# Altium integrated library Lattice CPLD ispLSI.IntLib: 471 symbols (part 4 of 26)
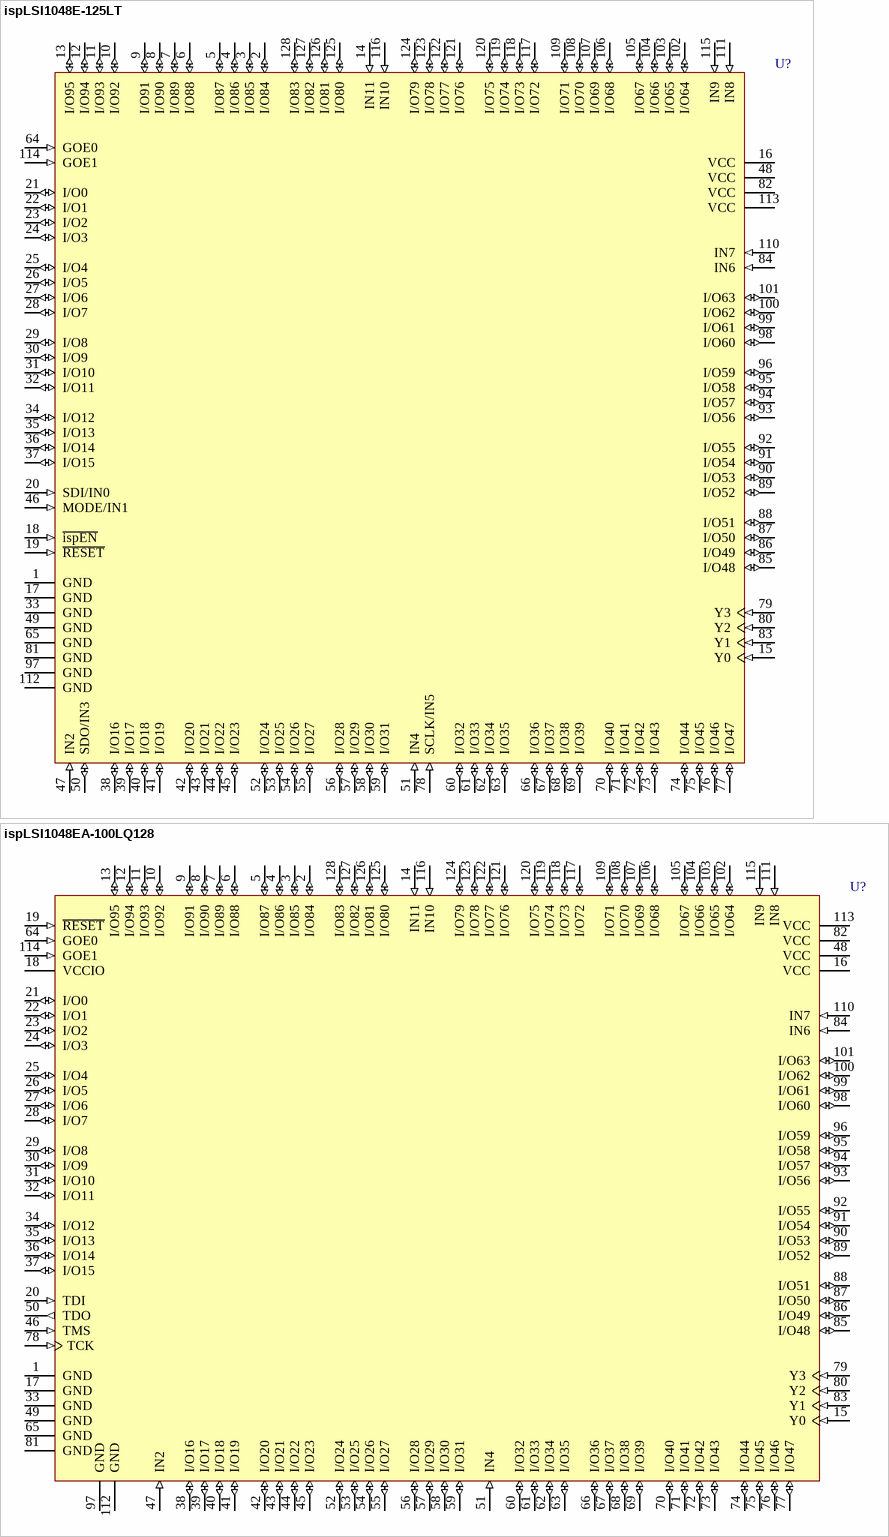
[diagram p234: symbols ispLSI1048E-125LT to ispLSI1048EA-100LQ128]

## ispLSI1048EA-100LQ128
designator U?
In-System Programmable High-Density PLD; Published: 23-Sep-2002; LatestRevisionDate: 13-Apr-2006; LatestRevisionNote: IPC-7351 Footprint Added.; DatasheetVersion: Jun-2000; PackageVersion: pkg_32, Aug-2005; PackageReference: PQFP128; Publisher: Altium Limited; PackageDescription: 128-Pin Quad Flat Pack 0.8 mm Pitch; Code_IPC: QFP80P3120X3120-128; ComponentLink1Description: Manufacturer Link; ComponentLink1URL: http://www.latticesemi.com/products/mature/index.cfm; ComponentLink2Description: Datasheet; ComponentLink2URL: http://www.latticesemi.com/lit/docs/datasheets/cpld/1048ea.pdf
footprint PQFP128_N (QFP, 128-Leads, Body 28x28mm, Pitch 0.8mm, IPC Medium Density)
footprint PQFP128_L (QFP, 128-Leads, Body 28x28mm, Pitch 0.8mm, IPC High Density)
footprint PQFP128_M (QFP, 128-Leads, Body 28x28mm, Pitch 0.8mm, IPC Low Density)
3D model 1048EA-PQFP128 (128-Pin Quad Flat Pack 0.8 mm Pitch)
pins: 1 GND (power), 2 I/O84 (io), 3 I/O85 (io), 4 I/O86 (io), 5 I/O87 (io), 6 I/O88 (io), 7 I/O89 (io), 8 I/O90 (io), 9 I/O91 (io), 10 I/O92 (io), 11 I/O93 (io), 12 I/O94 (io), 13 I/O95 (io), 14 IN11 (in), 15 Y0 (in), 16 VCC (power), 17 GND (power), 18 VCCIO (power), 19 ~{RESET} (in), 20 TDI (in), 21 I/O0 (io), 22 I/O1 (io), 23 I/O2 (io), 24 I/O3 (io), 25 I/O4 (io), 26 I/O5 (io), 27 I/O6 (io), 28 I/O7 (io), 29 I/O8 (io), 30 I/O9 (io), 31 I/O10 (io), 32 I/O11 (io), 33 GND (power), 34 I/O12 (io), 35 I/O13 (io), 36 I/O14 (io), 37 I/O15 (io), 38 I/O16 (io), 39 I/O17 (io), 40 I/O18 (io), 41 I/O19 (io), 42 I/O20 (io), 43 I/O21 (io), 44 I/O22 (io), 45 I/O23 (io), 46 TMS (in), 47 IN2 (in), 48 VCC (power), 49 GND (power), 50 TDO (out), 51 IN4 (in), 52 I/O24 (io), 53 I/O25 (io), 54 I/O26 (io), 55 I/O27 (io), 56 I/O28 (io), 57 I/O29 (io), 58 I/O30 (io), 59 I/O31 (io), 60 I/O32 (io), 61 I/O33 (io), 62 I/O34 (io), 63 I/O35 (io), 64 GOE0 (in), 65 GND (power), 66 I/O36 (io), 67 I/O37 (io), 68 I/O38 (io), 69 I/O39 (io), 70 I/O40 (io), 71 I/O41 (io), 72 I/O42 (io), 73 I/O43 (io), 74 I/O44 (io), 75 I/O45 (io), 76 I/O46 (io), 77 I/O47 (io), 78 TCK (in), 79 Y3 (in), 80 Y2 (in), 81 GND (power), 82 VCC (power), 83 Y1 (in), 84 IN6 (in), 85 I/O48 (io), 86 I/O49 (io), 87 I/O50 (io), 88 I/O51 (io), 89 I/O52 (io), 90 I/O53 (io), 91 I/O54 (io), 92 I/O55 (io), 93 I/O56 (io), 94 I/O57 (io), 95 I/O58 (io), 96 I/O59 (io), 97 GND (power), 98 I/O60 (io), 99 I/O61 (io), 100 I/O62 (io), 101 I/O63 (io), 102 I/O64 (io), 103 I/O65 (io), 104 I/O66 (io), 105 I/O67 (io), 106 I/O68 (io), 107 I/O69 (io), 108 I/O70 (io), 109 I/O71 (io), 110 IN7 (in), 111 IN8 (in), 112 GND (power), 113 VCC (power), 114 GOE1 (in), 115 IN9 (in), 116 IN10 (in), 117 I/O72 (io), 118 I/O73 (io), 119 I/O74 (io), 120 I/O75 (io), 121 I/O76 (io), 122 I/O77 (io), 123 I/O78 (io), 124 I/O79 (io), 125 I/O80 (io), 126 I/O81 (io), 127 I/O82 (io), 128 I/O83 (io)

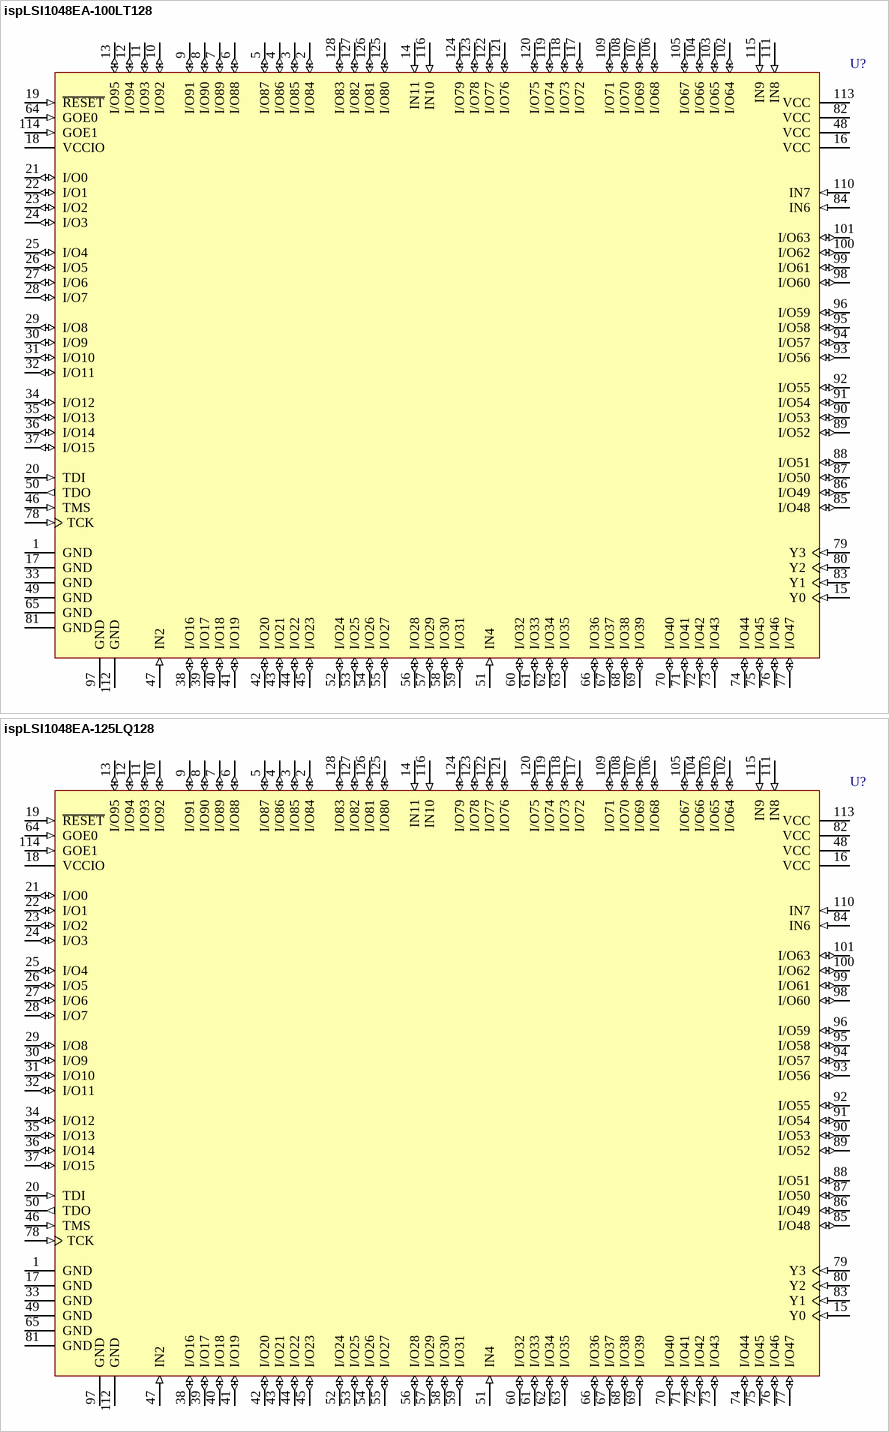
[diagram p29: symbols ispLSI1048EA-100LT128 to ispLSI1048EA-125LQ128]

## ispLSI1048EA-100LT128
designator U?
In-System Programmable High-Density PLD; Published: 23-Sep-2002; LatestRevisionDate: 13-Apr-2006; LatestRevisionNote: IPC-7351 Footprint Added.; DatasheetVersion: Jun-2000; PackageVersion: Aug-2005; PackageReference: TQFP128; Publisher: Altium Limited; PackageDescription: 128-Pin Thin Quad Flat Pack 0.4 mm Pitch; ComponentLink1Description: Manufacturer Link; ComponentLink1URL: http://www.latticesemi.com/products/mature/index.cfm; ComponentLink2Description: Datasheet; ComponentLink2URL: http://www.latticesemi.com/lit/docs/datasheets/cpld/1048ea.pdf
footprint TQFP128_N (Thin QFP, 128-Leads, Body 14x14mm, Pitch 0.4mm, IPC Medium Density)
footprint TQFP128_L (Thin QFP, 128-Leads, Body 14x14mm, Pitch 0.4mm, IPC High Density)
footprint TQFP128_M (Thin QFP, 128-Leads, Body 14x14mm, Pitch 0.4mm, IPC Low Density)
3D model 1048EA-TQFP128 (128-Pin Thin Quad Flat Pack 0.4 mm Pitch)
pins: 1 GND (power), 2 I/O84 (io), 3 I/O85 (io), 4 I/O86 (io), 5 I/O87 (io), 6 I/O88 (io), 7 I/O89 (io), 8 I/O90 (io), 9 I/O91 (io), 10 I/O92 (io), 11 I/O93 (io), 12 I/O94 (io), 13 I/O95 (io), 14 IN11 (in), 15 Y0 (in), 16 VCC (power), 17 GND (power), 18 VCCIO (power), 19 ~{RESET} (in), 20 TDI (in), 21 I/O0 (io), 22 I/O1 (io), 23 I/O2 (io), 24 I/O3 (io), 25 I/O4 (io), 26 I/O5 (io), 27 I/O6 (io), 28 I/O7 (io), 29 I/O8 (io), 30 I/O9 (io), 31 I/O10 (io), 32 I/O11 (io), 33 GND (power), 34 I/O12 (io), 35 I/O13 (io), 36 I/O14 (io), 37 I/O15 (io), 38 I/O16 (io), 39 I/O17 (io), 40 I/O18 (io), 41 I/O19 (io), 42 I/O20 (io), 43 I/O21 (io), 44 I/O22 (io), 45 I/O23 (io), 46 TMS (in), 47 IN2 (in), 48 VCC (power), 49 GND (power), 50 TDO (out), 51 IN4 (in), 52 I/O24 (io), 53 I/O25 (io), 54 I/O26 (io), 55 I/O27 (io), 56 I/O28 (io), 57 I/O29 (io), 58 I/O30 (io), 59 I/O31 (io), 60 I/O32 (io), 61 I/O33 (io), 62 I/O34 (io), 63 I/O35 (io), 64 GOE0 (in), 65 GND (power), 66 I/O36 (io), 67 I/O37 (io), 68 I/O38 (io), 69 I/O39 (io), 70 I/O40 (io), 71 I/O41 (io), 72 I/O42 (io), 73 I/O43 (io), 74 I/O44 (io), 75 I/O45 (io), 76 I/O46 (io), 77 I/O47 (io), 78 TCK (in), 79 Y3 (in), 80 Y2 (in), 81 GND (power), 82 VCC (power), 83 Y1 (in), 84 IN6 (in), 85 I/O48 (io), 86 I/O49 (io), 87 I/O50 (io), 88 I/O51 (io), 89 I/O52 (io), 90 I/O53 (io), 91 I/O54 (io), 92 I/O55 (io), 93 I/O56 (io), 94 I/O57 (io), 95 I/O58 (io), 96 I/O59 (io), 97 GND (power), 98 I/O60 (io), 99 I/O61 (io), 100 I/O62 (io), 101 I/O63 (io), 102 I/O64 (io), 103 I/O65 (io), 104 I/O66 (io), 105 I/O67 (io), 106 I/O68 (io), 107 I/O69 (io), 108 I/O70 (io), 109 I/O71 (io), 110 IN7 (in), 111 IN8 (in), 112 GND (power), 113 VCC (power), 114 GOE1 (in), 115 IN9 (in), 116 IN10 (in), 117 I/O72 (io), 118 I/O73 (io), 119 I/O74 (io), 120 I/O75 (io), 121 I/O76 (io), 122 I/O77 (io), 123 I/O78 (io), 124 I/O79 (io), 125 I/O80 (io), 126 I/O81 (io), 127 I/O82 (io), 128 I/O83 (io)

## ispLSI1048EA-125LQ128
designator U?
In-System Programmable High-Density PLD; Published: 23-Sep-2002; LatestRevisionDate: 13-Apr-2006; LatestRevisionNote: IPC-7351 Footprint Added.; DatasheetVersion: Jun-2000; PackageVersion: pkg_32, Aug-2005; PackageReference: PQFP128; Publisher: Altium Limited; PackageDescription: 128-Pin Quad Flat Pack 0.8 mm Pitch; Code_IPC: QFP80P3120X3120-128; ComponentLink1Description: Manufacturer Link; ComponentLink1URL: http://www.latticesemi.com/products/mature/index.cfm; ComponentLink2Description: Datasheet; ComponentLink2URL: http://www.latticesemi.com/lit/docs/datasheets/cpld/1048ea.pdf
footprint PQFP128_N (QFP, 128-Leads, Body 28x28mm, Pitch 0.8mm, IPC Medium Density)
footprint PQFP128_L (QFP, 128-Leads, Body 28x28mm, Pitch 0.8mm, IPC High Density)
footprint PQFP128_M (QFP, 128-Leads, Body 28x28mm, Pitch 0.8mm, IPC Low Density)
3D model 1048EA-PQFP128 (128-Pin Quad Flat Pack 0.8 mm Pitch)
pins: 1 GND (power), 2 I/O84 (io), 3 I/O85 (io), 4 I/O86 (io), 5 I/O87 (io), 6 I/O88 (io), 7 I/O89 (io), 8 I/O90 (io), 9 I/O91 (io), 10 I/O92 (io), 11 I/O93 (io), 12 I/O94 (io), 13 I/O95 (io), 14 IN11 (in), 15 Y0 (in), 16 VCC (power), 17 GND (power), 18 VCCIO (power), 19 ~{RESET} (in), 20 TDI (in), 21 I/O0 (io), 22 I/O1 (io), 23 I/O2 (io), 24 I/O3 (io), 25 I/O4 (io), 26 I/O5 (io), 27 I/O6 (io), 28 I/O7 (io), 29 I/O8 (io), 30 I/O9 (io), 31 I/O10 (io), 32 I/O11 (io), 33 GND (power), 34 I/O12 (io), 35 I/O13 (io), 36 I/O14 (io), 37 I/O15 (io), 38 I/O16 (io), 39 I/O17 (io), 40 I/O18 (io), 41 I/O19 (io), 42 I/O20 (io), 43 I/O21 (io), 44 I/O22 (io), 45 I/O23 (io), 46 TMS (in), 47 IN2 (in), 48 VCC (power), 49 GND (power), 50 TDO (out), 51 IN4 (in), 52 I/O24 (io), 53 I/O25 (io), 54 I/O26 (io), 55 I/O27 (io), 56 I/O28 (io), 57 I/O29 (io), 58 I/O30 (io), 59 I/O31 (io), 60 I/O32 (io), 61 I/O33 (io), 62 I/O34 (io), 63 I/O35 (io), 64 GOE0 (in), 65 GND (power), 66 I/O36 (io), 67 I/O37 (io), 68 I/O38 (io), 69 I/O39 (io), 70 I/O40 (io), 71 I/O41 (io), 72 I/O42 (io), 73 I/O43 (io), 74 I/O44 (io), 75 I/O45 (io), 76 I/O46 (io), 77 I/O47 (io), 78 TCK (in), 79 Y3 (in), 80 Y2 (in), 81 GND (power), 82 VCC (power), 83 Y1 (in), 84 IN6 (in), 85 I/O48 (io), 86 I/O49 (io), 87 I/O50 (io), 88 I/O51 (io), 89 I/O52 (io), 90 I/O53 (io), 91 I/O54 (io), 92 I/O55 (io), 93 I/O56 (io), 94 I/O57 (io), 95 I/O58 (io), 96 I/O59 (io), 97 GND (power), 98 I/O60 (io), 99 I/O61 (io), 100 I/O62 (io), 101 I/O63 (io), 102 I/O64 (io), 103 I/O65 (io), 104 I/O66 (io), 105 I/O67 (io), 106 I/O68 (io), 107 I/O69 (io), 108 I/O70 (io), 109 I/O71 (io), 110 IN7 (in), 111 IN8 (in), 112 GND (power), 113 VCC (power), 114 GOE1 (in), 115 IN9 (in), 116 IN10 (in), 117 I/O72 (io), 118 I/O73 (io), 119 I/O74 (io), 120 I/O75 (io), 121 I/O76 (io), 122 I/O77 (io), 123 I/O78 (io), 124 I/O79 (io), 125 I/O80 (io), 126 I/O81 (io), 127 I/O82 (io), 128 I/O83 (io)

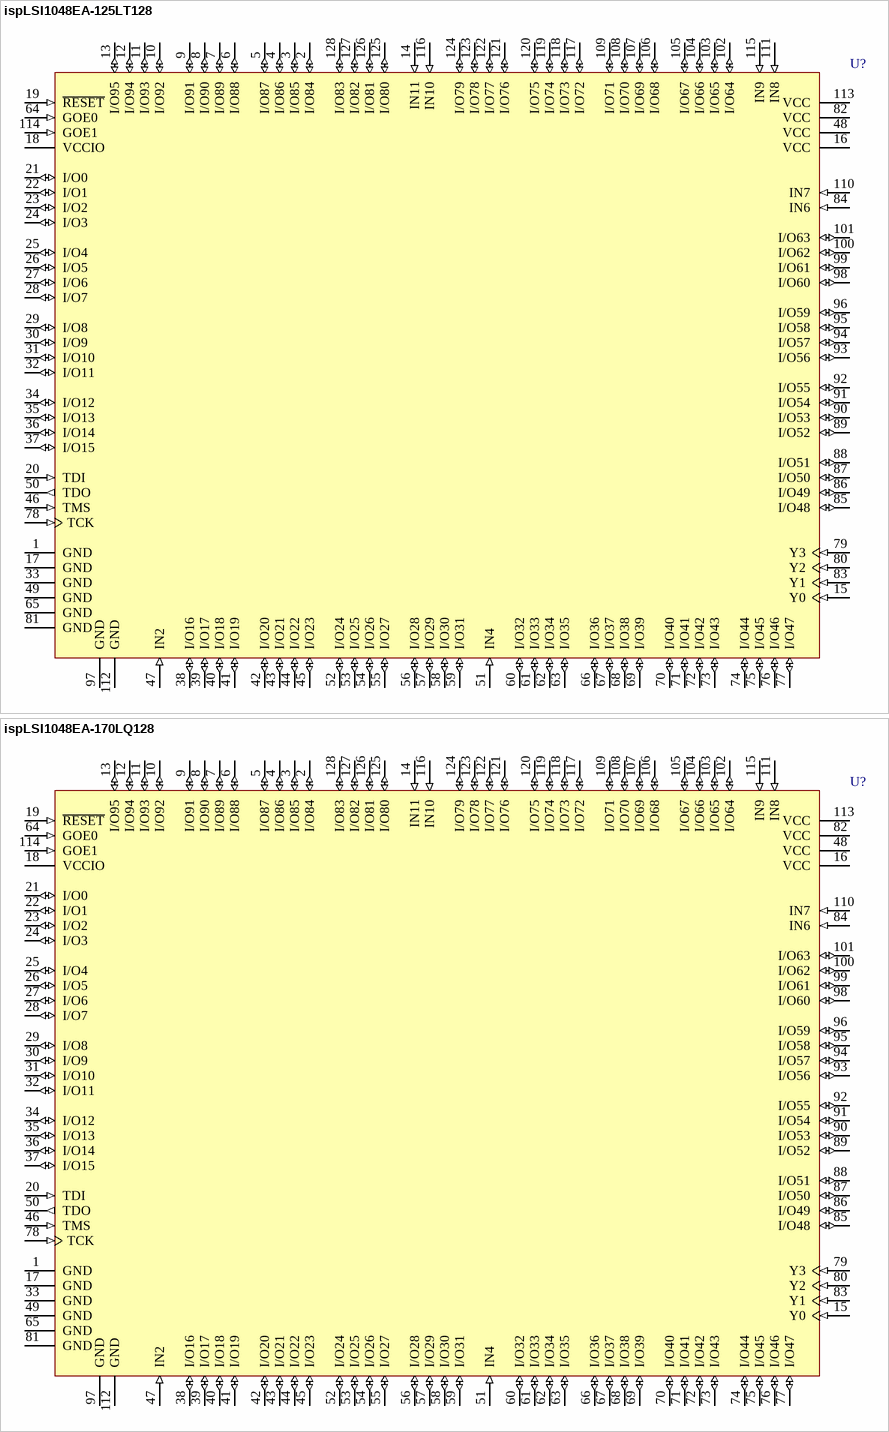
[diagram p30: symbols ispLSI1048EA-125LT128 to ispLSI1048EA-170LQ128]

## ispLSI1048EA-125LT128
designator U?
In-System Programmable High-Density PLD; Published: 23-Sep-2002; LatestRevisionDate: 13-Apr-2006; LatestRevisionNote: IPC-7351 Footprint Added.; DatasheetVersion: Jun-2000; PackageVersion: Aug-2005; PackageReference: TQFP128; Publisher: Altium Limited; PackageDescription: 128-Pin Thin Quad Flat Pack 0.4 mm Pitch; ComponentLink1Description: Manufacturer Link; ComponentLink1URL: http://www.latticesemi.com/products/mature/index.cfm; ComponentLink2Description: Datasheet; ComponentLink2URL: http://www.latticesemi.com/lit/docs/datasheets/cpld/1048ea.pdf
footprint TQFP128_N (Thin QFP, 128-Leads, Body 14x14mm, Pitch 0.4mm, IPC Medium Density)
footprint TQFP128_L (Thin QFP, 128-Leads, Body 14x14mm, Pitch 0.4mm, IPC High Density)
footprint TQFP128_M (Thin QFP, 128-Leads, Body 14x14mm, Pitch 0.4mm, IPC Low Density)
3D model 1048EA-TQFP128 (128-Pin Thin Quad Flat Pack 0.4 mm Pitch)
pins: 1 GND (power), 2 I/O84 (io), 3 I/O85 (io), 4 I/O86 (io), 5 I/O87 (io), 6 I/O88 (io), 7 I/O89 (io), 8 I/O90 (io), 9 I/O91 (io), 10 I/O92 (io), 11 I/O93 (io), 12 I/O94 (io), 13 I/O95 (io), 14 IN11 (in), 15 Y0 (in), 16 VCC (power), 17 GND (power), 18 VCCIO (power), 19 ~{RESET} (in), 20 TDI (in), 21 I/O0 (io), 22 I/O1 (io), 23 I/O2 (io), 24 I/O3 (io), 25 I/O4 (io), 26 I/O5 (io), 27 I/O6 (io), 28 I/O7 (io), 29 I/O8 (io), 30 I/O9 (io), 31 I/O10 (io), 32 I/O11 (io), 33 GND (power), 34 I/O12 (io), 35 I/O13 (io), 36 I/O14 (io), 37 I/O15 (io), 38 I/O16 (io), 39 I/O17 (io), 40 I/O18 (io), 41 I/O19 (io), 42 I/O20 (io), 43 I/O21 (io), 44 I/O22 (io), 45 I/O23 (io), 46 TMS (in), 47 IN2 (in), 48 VCC (power), 49 GND (power), 50 TDO (out), 51 IN4 (in), 52 I/O24 (io), 53 I/O25 (io), 54 I/O26 (io), 55 I/O27 (io), 56 I/O28 (io), 57 I/O29 (io), 58 I/O30 (io), 59 I/O31 (io), 60 I/O32 (io), 61 I/O33 (io), 62 I/O34 (io), 63 I/O35 (io), 64 GOE0 (in), 65 GND (power), 66 I/O36 (io), 67 I/O37 (io), 68 I/O38 (io), 69 I/O39 (io), 70 I/O40 (io), 71 I/O41 (io), 72 I/O42 (io), 73 I/O43 (io), 74 I/O44 (io), 75 I/O45 (io), 76 I/O46 (io), 77 I/O47 (io), 78 TCK (in), 79 Y3 (in), 80 Y2 (in), 81 GND (power), 82 VCC (power), 83 Y1 (in), 84 IN6 (in), 85 I/O48 (io), 86 I/O49 (io), 87 I/O50 (io), 88 I/O51 (io), 89 I/O52 (io), 90 I/O53 (io), 91 I/O54 (io), 92 I/O55 (io), 93 I/O56 (io), 94 I/O57 (io), 95 I/O58 (io), 96 I/O59 (io), 97 GND (power), 98 I/O60 (io), 99 I/O61 (io), 100 I/O62 (io), 101 I/O63 (io), 102 I/O64 (io), 103 I/O65 (io), 104 I/O66 (io), 105 I/O67 (io), 106 I/O68 (io), 107 I/O69 (io), 108 I/O70 (io), 109 I/O71 (io), 110 IN7 (in), 111 IN8 (in), 112 GND (power), 113 VCC (power), 114 GOE1 (in), 115 IN9 (in), 116 IN10 (in), 117 I/O72 (io), 118 I/O73 (io), 119 I/O74 (io), 120 I/O75 (io), 121 I/O76 (io), 122 I/O77 (io), 123 I/O78 (io), 124 I/O79 (io), 125 I/O80 (io), 126 I/O81 (io), 127 I/O82 (io), 128 I/O83 (io)

## ispLSI1048EA-170LQ128
designator U?
In-System Programmable High-Density PLD; Published: 23-Sep-2002; LatestRevisionDate: 13-Apr-2006; LatestRevisionNote: IPC-7351 Footprint Added.; DatasheetVersion: Jun-2000; PackageVersion: pkg_32, Aug-2005; PackageReference: PQFP128; Publisher: Altium Limited; PackageDescription: 128-Pin Quad Flat Pack 0.8 mm Pitch; Code_IPC: QFP80P3120X3120-128; ComponentLink1Description: Manufacturer Link; ComponentLink1URL: http://www.latticesemi.com/products/mature/index.cfm; ComponentLink2Description: Datasheet; ComponentLink2URL: http://www.latticesemi.com/lit/docs/datasheets/cpld/1048ea.pdf
footprint PQFP128_N (QFP, 128-Leads, Body 28x28mm, Pitch 0.8mm, IPC Medium Density)
footprint PQFP128_L (QFP, 128-Leads, Body 28x28mm, Pitch 0.8mm, IPC High Density)
footprint PQFP128_M (QFP, 128-Leads, Body 28x28mm, Pitch 0.8mm, IPC Low Density)
3D model 1048EA-PQFP128 (128-Pin Quad Flat Pack 0.8 mm Pitch)
pins: 1 GND (power), 2 I/O84 (io), 3 I/O85 (io), 4 I/O86 (io), 5 I/O87 (io), 6 I/O88 (io), 7 I/O89 (io), 8 I/O90 (io), 9 I/O91 (io), 10 I/O92 (io), 11 I/O93 (io), 12 I/O94 (io), 13 I/O95 (io), 14 IN11 (in), 15 Y0 (in), 16 VCC (power), 17 GND (power), 18 VCCIO (power), 19 ~{RESET} (in), 20 TDI (in), 21 I/O0 (io), 22 I/O1 (io), 23 I/O2 (io), 24 I/O3 (io), 25 I/O4 (io), 26 I/O5 (io), 27 I/O6 (io), 28 I/O7 (io), 29 I/O8 (io), 30 I/O9 (io), 31 I/O10 (io), 32 I/O11 (io), 33 GND (power), 34 I/O12 (io), 35 I/O13 (io), 36 I/O14 (io), 37 I/O15 (io), 38 I/O16 (io), 39 I/O17 (io), 40 I/O18 (io), 41 I/O19 (io), 42 I/O20 (io), 43 I/O21 (io), 44 I/O22 (io), 45 I/O23 (io), 46 TMS (in), 47 IN2 (in), 48 VCC (power), 49 GND (power), 50 TDO (out), 51 IN4 (in), 52 I/O24 (io), 53 I/O25 (io), 54 I/O26 (io), 55 I/O27 (io), 56 I/O28 (io), 57 I/O29 (io), 58 I/O30 (io), 59 I/O31 (io), 60 I/O32 (io), 61 I/O33 (io), 62 I/O34 (io), 63 I/O35 (io), 64 GOE0 (in), 65 GND (power), 66 I/O36 (io), 67 I/O37 (io), 68 I/O38 (io), 69 I/O39 (io), 70 I/O40 (io), 71 I/O41 (io), 72 I/O42 (io), 73 I/O43 (io), 74 I/O44 (io), 75 I/O45 (io), 76 I/O46 (io), 77 I/O47 (io), 78 TCK (in), 79 Y3 (in), 80 Y2 (in), 81 GND (power), 82 VCC (power), 83 Y1 (in), 84 IN6 (in), 85 I/O48 (io), 86 I/O49 (io), 87 I/O50 (io), 88 I/O51 (io), 89 I/O52 (io), 90 I/O53 (io), 91 I/O54 (io), 92 I/O55 (io), 93 I/O56 (io), 94 I/O57 (io), 95 I/O58 (io), 96 I/O59 (io), 97 GND (power), 98 I/O60 (io), 99 I/O61 (io), 100 I/O62 (io), 101 I/O63 (io), 102 I/O64 (io), 103 I/O65 (io), 104 I/O66 (io), 105 I/O67 (io), 106 I/O68 (io), 107 I/O69 (io), 108 I/O70 (io), 109 I/O71 (io), 110 IN7 (in), 111 IN8 (in), 112 GND (power), 113 VCC (power), 114 GOE1 (in), 115 IN9 (in), 116 IN10 (in), 117 I/O72 (io), 118 I/O73 (io), 119 I/O74 (io), 120 I/O75 (io), 121 I/O76 (io), 122 I/O77 (io), 123 I/O78 (io), 124 I/O79 (io), 125 I/O80 (io), 126 I/O81 (io), 127 I/O82 (io), 128 I/O83 (io)

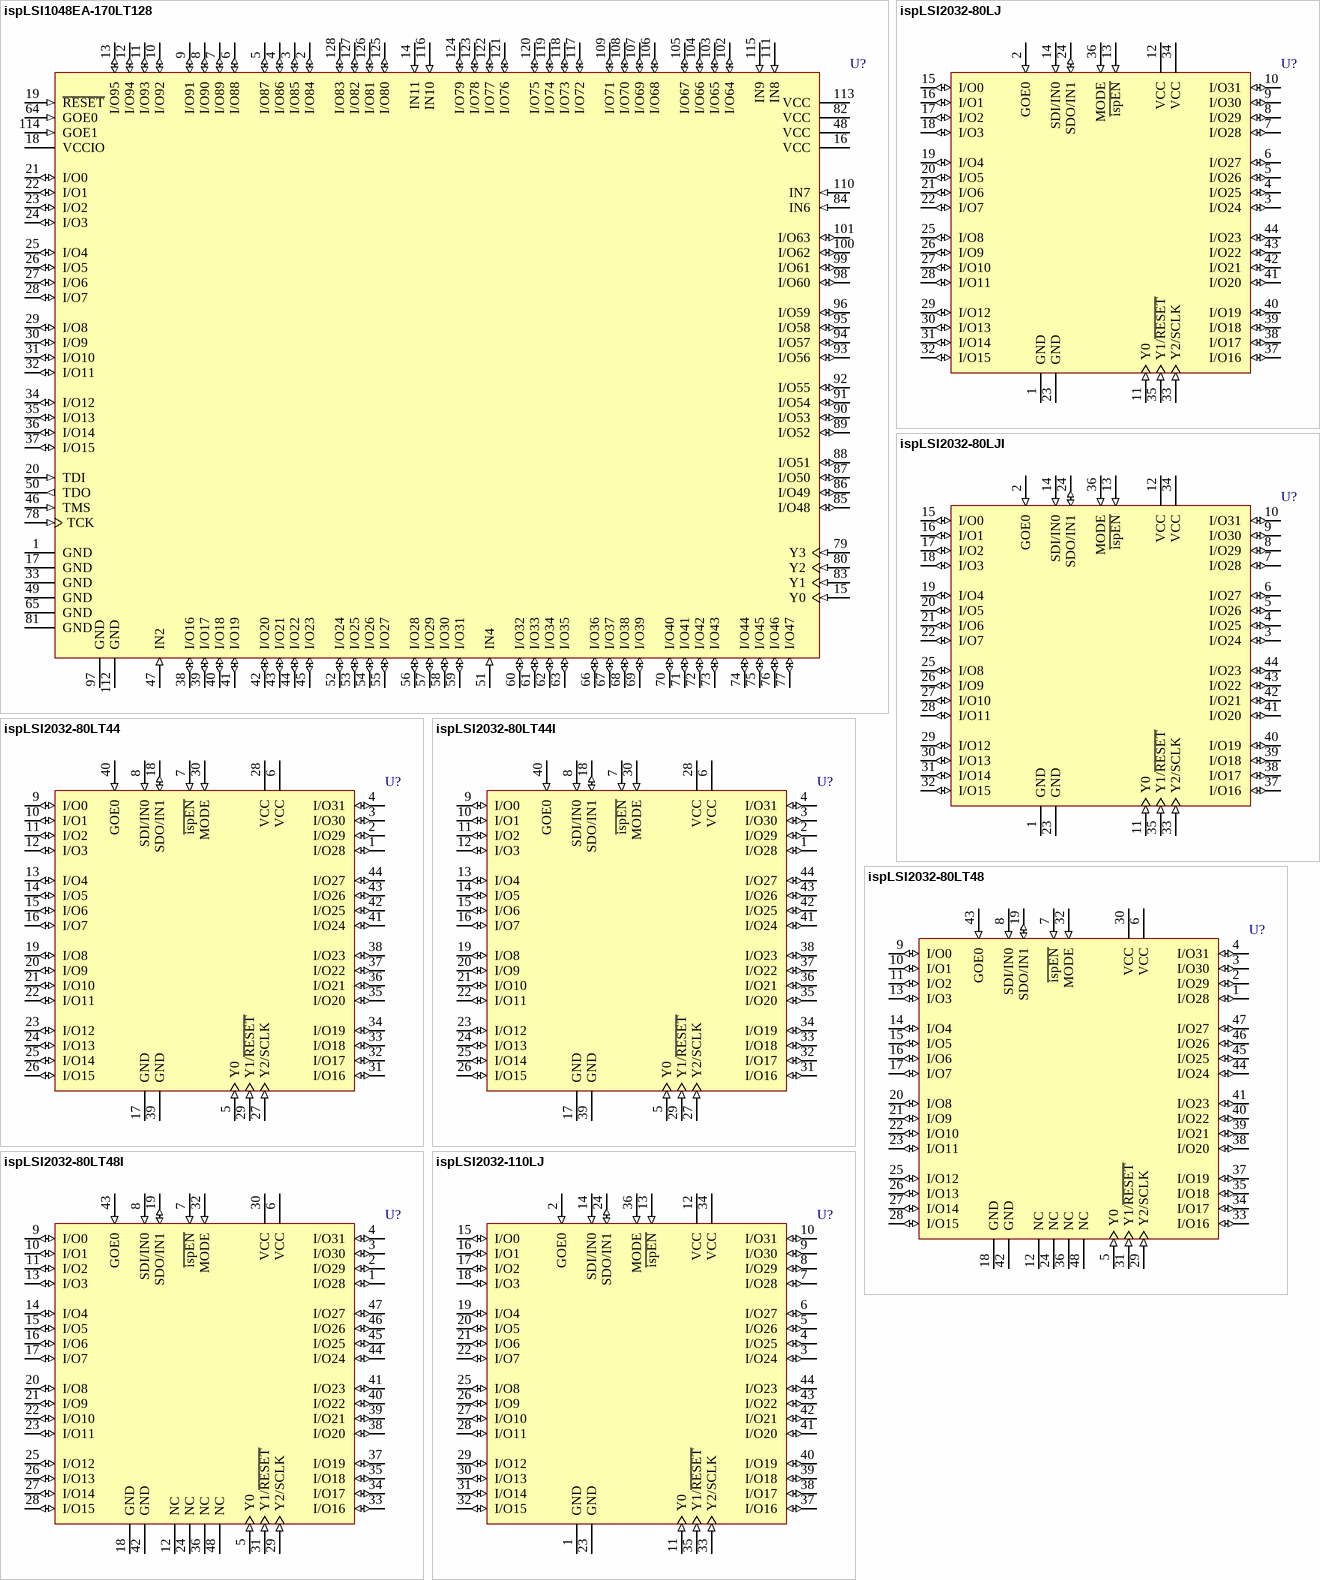
[diagram p31: symbols ispLSI1048EA-170LT128 to ispLSI2032-110LJ]

## ispLSI1048EA-170LT128
designator U?
In-System Programmable High-Density PLD; Published: 23-Sep-2002; LatestRevisionDate: 13-Apr-2006; LatestRevisionNote: IPC-7351 Footprint Added.; DatasheetVersion: Jun-2000; PackageVersion: Aug-2005; PackageReference: TQFP128; Publisher: Altium Limited; PackageDescription: 128-Pin Thin Quad Flat Pack 0.4 mm Pitch; ComponentLink1Description: Manufacturer Link; ComponentLink1URL: http://www.latticesemi.com/products/mature/index.cfm; ComponentLink2Description: Datasheet; ComponentLink2URL: http://www.latticesemi.com/lit/docs/datasheets/cpld/1048ea.pdf
footprint TQFP128_N (Thin QFP, 128-Leads, Body 14x14mm, Pitch 0.4mm, IPC Medium Density)
footprint TQFP128_L (Thin QFP, 128-Leads, Body 14x14mm, Pitch 0.4mm, IPC High Density)
footprint TQFP128_M (Thin QFP, 128-Leads, Body 14x14mm, Pitch 0.4mm, IPC Low Density)
3D model 1048EA-TQFP128 (128-Pin Thin Quad Flat Pack 0.4 mm Pitch)
pins: 1 GND (power), 2 I/O84 (io), 3 I/O85 (io), 4 I/O86 (io), 5 I/O87 (io), 6 I/O88 (io), 7 I/O89 (io), 8 I/O90 (io), 9 I/O91 (io), 10 I/O92 (io), 11 I/O93 (io), 12 I/O94 (io), 13 I/O95 (io), 14 IN11 (in), 15 Y0 (in), 16 VCC (power), 17 GND (power), 18 VCCIO (power), 19 ~{RESET} (in), 20 TDI (in), 21 I/O0 (io), 22 I/O1 (io), 23 I/O2 (io), 24 I/O3 (io), 25 I/O4 (io), 26 I/O5 (io), 27 I/O6 (io), 28 I/O7 (io), 29 I/O8 (io), 30 I/O9 (io), 31 I/O10 (io), 32 I/O11 (io), 33 GND (power), 34 I/O12 (io), 35 I/O13 (io), 36 I/O14 (io), 37 I/O15 (io), 38 I/O16 (io), 39 I/O17 (io), 40 I/O18 (io), 41 I/O19 (io), 42 I/O20 (io), 43 I/O21 (io), 44 I/O22 (io), 45 I/O23 (io), 46 TMS (in), 47 IN2 (in), 48 VCC (power), 49 GND (power), 50 TDO (out), 51 IN4 (in), 52 I/O24 (io), 53 I/O25 (io), 54 I/O26 (io), 55 I/O27 (io), 56 I/O28 (io), 57 I/O29 (io), 58 I/O30 (io), 59 I/O31 (io), 60 I/O32 (io), 61 I/O33 (io), 62 I/O34 (io), 63 I/O35 (io), 64 GOE0 (in), 65 GND (power), 66 I/O36 (io), 67 I/O37 (io), 68 I/O38 (io), 69 I/O39 (io), 70 I/O40 (io), 71 I/O41 (io), 72 I/O42 (io), 73 I/O43 (io), 74 I/O44 (io), 75 I/O45 (io), 76 I/O46 (io), 77 I/O47 (io), 78 TCK (in), 79 Y3 (in), 80 Y2 (in), 81 GND (power), 82 VCC (power), 83 Y1 (in), 84 IN6 (in), 85 I/O48 (io), 86 I/O49 (io), 87 I/O50 (io), 88 I/O51 (io), 89 I/O52 (io), 90 I/O53 (io), 91 I/O54 (io), 92 I/O55 (io), 93 I/O56 (io), 94 I/O57 (io), 95 I/O58 (io), 96 I/O59 (io), 97 GND (power), 98 I/O60 (io), 99 I/O61 (io), 100 I/O62 (io), 101 I/O63 (io), 102 I/O64 (io), 103 I/O65 (io), 104 I/O66 (io), 105 I/O67 (io), 106 I/O68 (io), 107 I/O69 (io), 108 I/O70 (io), 109 I/O71 (io), 110 IN7 (in), 111 IN8 (in), 112 GND (power), 113 VCC (power), 114 GOE1 (in), 115 IN9 (in), 116 IN10 (in), 117 I/O72 (io), 118 I/O73 (io), 119 I/O74 (io), 120 I/O75 (io), 121 I/O76 (io), 122 I/O77 (io), 123 I/O78 (io), 124 I/O79 (io), 125 I/O80 (io), 126 I/O81 (io), 127 I/O82 (io), 128 I/O83 (io)

## ispLSI2032-80LJ
designator U?
In-System Programmable High-Density PLD; Note: Pins 14, 24 and 33 have dual function capability.; Published: 23-Sep-2002; LatestRevisionDate: 13-Apr-2006; LatestRevisionNote: IPC-7351 Footprint Added.; DatasheetVersion: Apr-2000; PackageVersion: pkg_32, Aug-2005; PackageReference: PLCC44; Publisher: Altium Limited; PackageDescription: 44-Pin Leaded Chip Carrier 1.27 mm Pitch; Code_IPC: PLCC-44; ComponentLink1Description: Manufacturer Link; ComponentLink1URL: http://www.latticesemi.com/products/mature/index.cfm; ComponentLink2Description: Datasheet; ComponentLink2URL: http://www.latticesemi.com/lit/docs/datasheets/cpld/2032.pdf
footprint PLCC44_N (Leaded Chip Carrier, 44-Leads, Body 16.6x16.6mm, Pitch 1.27mm, IPC Medium Density)
footprint PLCC44_L (Leaded Chip Carrier, 44-Leads, Body 16.6x16.6mm, Pitch 1.27mm, IPC High Density)
footprint PLCC44_M (Leaded Chip Carrier, 44-Leads, Body 16.6x16.6mm, Pitch 1.27mm, IPC Low Density)
3D model 2032-PLCC44 (44-Pin Leaded Chip Carrier 1.27 mm Pitch)
pins: 1 GND (power), 2 GOE0 (in), 3 I/O24 (io), 4 I/O25 (io), 5 I/O26 (io), 6 I/O27 (io), 7 I/O28 (io), 8 I/O29 (io), 9 I/O30 (io), 10 I/O31 (io), 11 Y0 (in), 12 VCC (power), 13 ~{ispEN} (in), 14 SDI/IN0 (in), 15 I/O0 (io), 16 I/O1 (io), 17 I/O2 (io), 18 I/O3 (io), 19 I/O4 (io), 20 I/O5 (io), 21 I/O6 (io), 22 I/O7 (io), 23 GND (power), 24 SDO/IN1 (io), 25 I/O8 (io), 26 I/O9 (io), 27 I/O10 (io), 28 I/O11 (io), 29 I/O12 (io), 30 I/O13 (io), 31 I/O14 (io), 32 I/O15 (io), 33 Y2/SCLK (in), 34 VCC (power), 35 Y1/~{RESET} (in), 36 MODE (in), 37 I/O16 (io), 38 I/O17 (io), 39 I/O18 (io), 40 I/O19 (io), 41 I/O20 (io), 42 I/O21 (io), 43 I/O22 (io), 44 I/O23 (io)

## ispLSI2032-80LJI
designator U?
In-System Programmable High-Density PLD; Note: Pins 14, 24 and 33 have dual function capability.; Published: 23-Sep-2002; LatestRevisionDate: 13-Apr-2006; LatestRevisionNote: IPC-7351 Footprint Added.; DatasheetVersion: Apr-2000; PackageVersion: pkg_32, Aug-2005; PackageReference: PLCC44; Publisher: Altium Limited; PackageDescription: 44-Pin Leaded Chip Carrier 1.27 mm Pitch; Code_IPC: PLCC-44; ComponentLink1Description: Manufacturer Link; ComponentLink1URL: http://www.latticesemi.com/products/mature/index.cfm; ComponentLink2Description: Datasheet; ComponentLink2URL: http://www.latticesemi.com/lit/docs/datasheets/cpld/2032.pdf
footprint PLCC44_N (Leaded Chip Carrier, 44-Leads, Body 16.6x16.6mm, Pitch 1.27mm, IPC Medium Density)
footprint PLCC44_L (Leaded Chip Carrier, 44-Leads, Body 16.6x16.6mm, Pitch 1.27mm, IPC High Density)
footprint PLCC44_M (Leaded Chip Carrier, 44-Leads, Body 16.6x16.6mm, Pitch 1.27mm, IPC Low Density)
3D model 2032-PLCC44 (44-Pin Leaded Chip Carrier 1.27 mm Pitch)
pins: 1 GND (power), 2 GOE0 (in), 3 I/O24 (io), 4 I/O25 (io), 5 I/O26 (io), 6 I/O27 (io), 7 I/O28 (io), 8 I/O29 (io), 9 I/O30 (io), 10 I/O31 (io), 11 Y0 (in), 12 VCC (power), 13 ~{ispEN} (in), 14 SDI/IN0 (in), 15 I/O0 (io), 16 I/O1 (io), 17 I/O2 (io), 18 I/O3 (io), 19 I/O4 (io), 20 I/O5 (io), 21 I/O6 (io), 22 I/O7 (io), 23 GND (power), 24 SDO/IN1 (io), 25 I/O8 (io), 26 I/O9 (io), 27 I/O10 (io), 28 I/O11 (io), 29 I/O12 (io), 30 I/O13 (io), 31 I/O14 (io), 32 I/O15 (io), 33 Y2/SCLK (in), 34 VCC (power), 35 Y1/~{RESET} (in), 36 MODE (in), 37 I/O16 (io), 38 I/O17 (io), 39 I/O18 (io), 40 I/O19 (io), 41 I/O20 (io), 42 I/O21 (io), 43 I/O22 (io), 44 I/O23 (io)

## ispLSI2032-80LT44
designator U?
In-System Programmable High-Density PLD; Note: Pins 8, 18 and 27 have dual function capability.; Published: 23-Sep-2002; LatestRevisionDate: 13-Apr-2006; LatestRevisionNote: IPC-7351 Footprint Added.; DatasheetVersion: Apr-2000; PackageVersion: pkg_32, Aug-2005; PackageReference: TQFP44; Publisher: Altium Limited; PackageDescription: 44-Pin Thin Quad Flat Pack 0.8 mm Pitch; ComponentLink1Description: Manufacturer Link; ComponentLink1URL: http://www.latticesemi.com/products/mature/index.cfm; ComponentLink2Description: Datasheet; ComponentLink2URL: http://www.latticesemi.com/lit/docs/datasheets/cpld/2032.pdf
footprint TQFP44_N (Thin QFP, 44-Leads, Body 10x10mm, Pitch 0.8mm, IPC Medium Density)
footprint TQFP44_L (Thin QFP, 44-Leads, Body 10x10mm, Pitch 0.8mm, IPC High Density)
footprint TQFP44_M (Thin QFP, 44-Leads, Body 10x10mm, Pitch 0.8mm, IPC Low Density)
3D model 2032-TQFP44 (44-Pin Thin Quad Flat Pack 0.8 mm Pitch)
pins: 1 I/O28 (io), 2 I/O29 (io), 3 I/O30 (io), 4 I/O31 (io), 5 Y0 (in), 6 VCC (power), 7 ~{ispEN} (in), 8 SDI/IN0 (in), 9 I/O0 (io), 10 I/O1 (io), 11 I/O2 (io), 12 I/O3 (io), 13 I/O4 (io), 14 I/O5 (io), 15 I/O6 (io), 16 I/O7 (io), 17 GND (power), 18 SDO/IN1 (io), 19 I/O8 (io), 20 I/O9 (io), 21 I/O10 (io), 22 I/O11 (io), 23 I/O12 (io), 24 I/O13 (io), 25 I/O14 (io), 26 I/O15 (io), 27 Y2/SCLK (in), 28 VCC (power), 29 Y1/~{RESET} (in), 30 MODE (in), 31 I/O16 (io), 32 I/O17 (io), 33 I/O18 (io), 34 I/O19 (io), 35 I/O20 (io), 36 I/O21 (io), 37 I/O22 (io), 38 I/O23 (io), 39 GND (power), 40 GOE0 (in), 41 I/O24 (io), 42 I/O25 (io), 43 I/O26 (io), 44 I/O27 (io)

## ispLSI2032-80LT44I
designator U?
In-System Programmable High-Density PLD; Note: Pins 8, 18 and 27 have dual function capability.; Published: 23-Sep-2002; LatestRevisionDate: 13-Apr-2006; LatestRevisionNote: IPC-7351 Footprint Added.; DatasheetVersion: Apr-2000; PackageVersion: pkg_32, Aug-2005; PackageReference: TQFP44; Publisher: Altium Limited; PackageDescription: 44-Pin Thin Quad Flat Pack 0.8 mm Pitch; ComponentLink1Description: Manufacturer Link; ComponentLink1URL: http://www.latticesemi.com/products/mature/index.cfm; ComponentLink2Description: Datasheet; ComponentLink2URL: http://www.latticesemi.com/lit/docs/datasheets/cpld/2032.pdf
footprint TQFP44_N (Thin QFP, 44-Leads, Body 10x10mm, Pitch 0.8mm, IPC Medium Density)
footprint TQFP44_L (Thin QFP, 44-Leads, Body 10x10mm, Pitch 0.8mm, IPC High Density)
footprint TQFP44_M (Thin QFP, 44-Leads, Body 10x10mm, Pitch 0.8mm, IPC Low Density)
3D model 2032-TQFP44 (44-Pin Thin Quad Flat Pack 0.8 mm Pitch)
pins: 1 I/O28 (io), 2 I/O29 (io), 3 I/O30 (io), 4 I/O31 (io), 5 Y0 (in), 6 VCC (power), 7 ~{ispEN} (in), 8 SDI/IN0 (in), 9 I/O0 (io), 10 I/O1 (io), 11 I/O2 (io), 12 I/O3 (io), 13 I/O4 (io), 14 I/O5 (io), 15 I/O6 (io), 16 I/O7 (io), 17 GND (power), 18 SDO/IN1 (io), 19 I/O8 (io), 20 I/O9 (io), 21 I/O10 (io), 22 I/O11 (io), 23 I/O12 (io), 24 I/O13 (io), 25 I/O14 (io), 26 I/O15 (io), 27 Y2/SCLK (in), 28 VCC (power), 29 Y1/~{RESET} (in), 30 MODE (in), 31 I/O16 (io), 32 I/O17 (io), 33 I/O18 (io), 34 I/O19 (io), 35 I/O20 (io), 36 I/O21 (io), 37 I/O22 (io), 38 I/O23 (io), 39 GND (power), 40 GOE0 (in), 41 I/O24 (io), 42 I/O25 (io), 43 I/O26 (io), 44 I/O27 (io)

## ispLSI2032-80LT48
designator U?
In-System Programmable High-Density PLD; Note: Pins 8, 19 and 29 have dual function capability.; Published: 23-Sep-2002; LatestRevisionDate: 13-Apr-2006; LatestRevisionNote: IPC-7351 Footprint Added.; DatasheetVersion: Apr-2000; PackageVersion: pkg_32, Aug-2005; PackageReference: TQFP48; Publisher: Altium Limited; PackageDescription: 48-Pin Thin Quad Flat Pack 0.5 mm Pitch; ComponentLink1Description: Manufacturer Link; ComponentLink1URL: http://www.latticesemi.com/products/mature/index.cfm; ComponentLink2Description: Datasheet; ComponentLink2URL: http://www.latticesemi.com/lit/docs/datasheets/cpld/2032.pdf
footprint TQFP48_N (Thin QFP, 48-Leads, Body 7x7mm, Pitch 0.5mm, IPC Medium Density)
footprint TQFP48_L (Thin QFP, 48-Leads, Body 7x7mm, Pitch 0.5mm, IPC High Density)
footprint TQFP48_M (Thin QFP, 48-Leads, Body 7x7mm, Pitch 0.5mm, IPC Low Density)
3D model 2032-TQFP48 (48-Pin Thin Quad Flat Pack 0.5 mm Pitch)
pins: 1 I/O28 (io), 2 I/O29 (io), 3 I/O30 (io), 4 I/O31 (io), 5 Y0 (in), 6 VCC (power), 7 ~{ispEN} (in), 8 SDI/IN0 (in), 9 I/O0 (io), 10 I/O1 (io), 11 I/O2 (io), 12 NC, 13 I/O3 (io), 14 I/O4 (io), 15 I/O5 (io), 16 I/O6 (io), 17 I/O7 (io), 18 GND (power), 19 SDO/IN1 (io), 20 I/O8 (io), 21 I/O9 (io), 22 I/O10 (io), 23 I/O11 (io), 24 NC, 25 I/O12 (io), 26 I/O13 (io), 27 I/O14 (io), 28 I/O15 (io), 29 Y2/SCLK (in), 30 VCC (power), 31 Y1/~{RESET} (in), 32 MODE (in), 33 I/O16 (io), 34 I/O17 (io), 35 I/O18 (io), 36 NC, 37 I/O19 (io), 38 I/O20 (io), 39 I/O21 (io), 40 I/O22 (io), 41 I/O23 (io), 42 GND (power), 43 GOE0 (in), 44 I/O24 (io), 45 I/O25 (io), 46 I/O26 (io), 47 I/O27 (io), 48 NC

## ispLSI2032-80LT48I
designator U?
In-System Programmable High-Density PLD; Note: Pins 8, 19 and 29 have dual function capability.; Published: 23-Sep-2002; LatestRevisionDate: 13-Apr-2006; LatestRevisionNote: IPC-7351 Footprint Added.; DatasheetVersion: Apr-2000; PackageVersion: pkg_32, Aug-2005; PackageReference: TQFP48; Publisher: Altium Limited; PackageDescription: 48-Pin Thin Quad Flat Pack 0.5 mm Pitch; ComponentLink1Description: Manufacturer Link; ComponentLink1URL: http://www.latticesemi.com/products/mature/index.cfm; ComponentLink2Description: Datasheet; ComponentLink2URL: http://www.latticesemi.com/lit/docs/datasheets/cpld/2032.pdf
footprint TQFP48_N (Thin QFP, 48-Leads, Body 7x7mm, Pitch 0.5mm, IPC Medium Density)
footprint TQFP48_L (Thin QFP, 48-Leads, Body 7x7mm, Pitch 0.5mm, IPC High Density)
footprint TQFP48_M (Thin QFP, 48-Leads, Body 7x7mm, Pitch 0.5mm, IPC Low Density)
3D model 2032-TQFP48 (48-Pin Thin Quad Flat Pack 0.5 mm Pitch)
pins: 1 I/O28 (io), 2 I/O29 (io), 3 I/O30 (io), 4 I/O31 (io), 5 Y0 (in), 6 VCC (power), 7 ~{ispEN} (in), 8 SDI/IN0 (in), 9 I/O0 (io), 10 I/O1 (io), 11 I/O2 (io), 12 NC, 13 I/O3 (io), 14 I/O4 (io), 15 I/O5 (io), 16 I/O6 (io), 17 I/O7 (io), 18 GND (power), 19 SDO/IN1 (io), 20 I/O8 (io), 21 I/O9 (io), 22 I/O10 (io), 23 I/O11 (io), 24 NC, 25 I/O12 (io), 26 I/O13 (io), 27 I/O14 (io), 28 I/O15 (io), 29 Y2/SCLK (in), 30 VCC (power), 31 Y1/~{RESET} (in), 32 MODE (in), 33 I/O16 (io), 34 I/O17 (io), 35 I/O18 (io), 36 NC, 37 I/O19 (io), 38 I/O20 (io), 39 I/O21 (io), 40 I/O22 (io), 41 I/O23 (io), 42 GND (power), 43 GOE0 (in), 44 I/O24 (io), 45 I/O25 (io), 46 I/O26 (io), 47 I/O27 (io), 48 NC

## ispLSI2032-110LJ
designator U?
In-System Programmable High-Density PLD; Note: Pins 14, 24 and 33 have dual function capability.; Published: 23-Sep-2002; LatestRevisionDate: 13-Apr-2006; LatestRevisionNote: IPC-7351 Footprint Added.; DatasheetVersion: Apr-2000; PackageVersion: pkg_32, Aug-2005; PackageReference: PLCC44; Publisher: Altium Limited; PackageDescription: 44-Pin Leaded Chip Carrier 1.27 mm Pitch; Code_IPC: PLCC-44; ComponentLink1Description: Manufacturer Link; ComponentLink1URL: http://www.latticesemi.com/products/mature/index.cfm; ComponentLink2Description: Datasheet; ComponentLink2URL: http://www.latticesemi.com/lit/docs/datasheets/cpld/2032.pdf
footprint PLCC44_N (Leaded Chip Carrier, 44-Leads, Body 16.6x16.6mm, Pitch 1.27mm, IPC Medium Density)
footprint PLCC44_L (Leaded Chip Carrier, 44-Leads, Body 16.6x16.6mm, Pitch 1.27mm, IPC High Density)
footprint PLCC44_M (Leaded Chip Carrier, 44-Leads, Body 16.6x16.6mm, Pitch 1.27mm, IPC Low Density)
3D model 2032-PLCC44 (44-Pin Leaded Chip Carrier 1.27 mm Pitch)
pins: 1 GND (power), 2 GOE0 (in), 3 I/O24 (io), 4 I/O25 (io), 5 I/O26 (io), 6 I/O27 (io), 7 I/O28 (io), 8 I/O29 (io), 9 I/O30 (io), 10 I/O31 (io), 11 Y0 (in), 12 VCC (power), 13 ~{ispEN} (in), 14 SDI/IN0 (in), 15 I/O0 (io), 16 I/O1 (io), 17 I/O2 (io), 18 I/O3 (io), 19 I/O4 (io), 20 I/O5 (io), 21 I/O6 (io), 22 I/O7 (io), 23 GND (power), 24 SDO/IN1 (io), 25 I/O8 (io), 26 I/O9 (io), 27 I/O10 (io), 28 I/O11 (io), 29 I/O12 (io), 30 I/O13 (io), 31 I/O14 (io), 32 I/O15 (io), 33 Y2/SCLK (in), 34 VCC (power), 35 Y1/~{RESET} (in), 36 MODE (in), 37 I/O16 (io), 38 I/O17 (io), 39 I/O18 (io), 40 I/O19 (io), 41 I/O20 (io), 42 I/O21 (io), 43 I/O22 (io), 44 I/O23 (io)
